# Altium footprint library Film-cap.PcbLib: 33 footprints (part 3 of 3)
Each footprint in its own frame and in the unit in brackets; x right, y up, seen from the top. Pads: shape width x height; smd on the part's side, far side on the other; paste and mask are expansions set on the pad; w line width, h text height; cw(c..) or ccw(c..) is an arc to the next point about the centre after c.
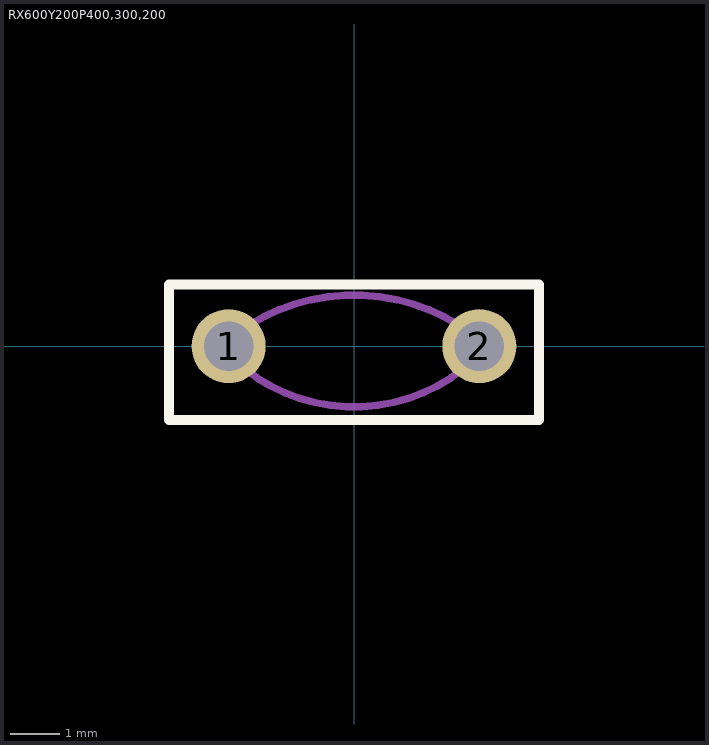
[diagram p2: the footprint, top view; thin cyan lines are the x and y axes]

## RX600Y200P400,300,200 [mm]
pads (2):
  round 1.5 hole 1: 1(-2.54,0) 2(2.54,0)
Top Overlay:
  lines w0.203: -3.75,-1.5 3.75,-1.5 3.75,1.25 -3.75,1.25 -3.75,-1.5
Top Assembly:
  circle w0.254: c2.693,0 r0.1
  circle w0.254: c-2.693,0 r0.1
  lines w0.15: -2.693,0 ccw(c0,2.323) 2.693,0 ccw(c0,-2.987) -2.693,0
3D body "User Library-Cer-Cap2_5 (5x1_5).step": height 7, standoff -1, extent -2.739,-1.233 2.739,1.034